# Altium footprint library cool_library.PcbLib: 1182 footprints (part 6 of 75)
Each footprint in its own frame and in the unit in brackets; x right, y up, seen from the top. Pads: shape width x height; smd on the part's side, far side on the other; paste and mask are expansions set on the pad; w line width, h text height; cw(c..) or ccw(c..) is an arc to the next point about the centre after c.
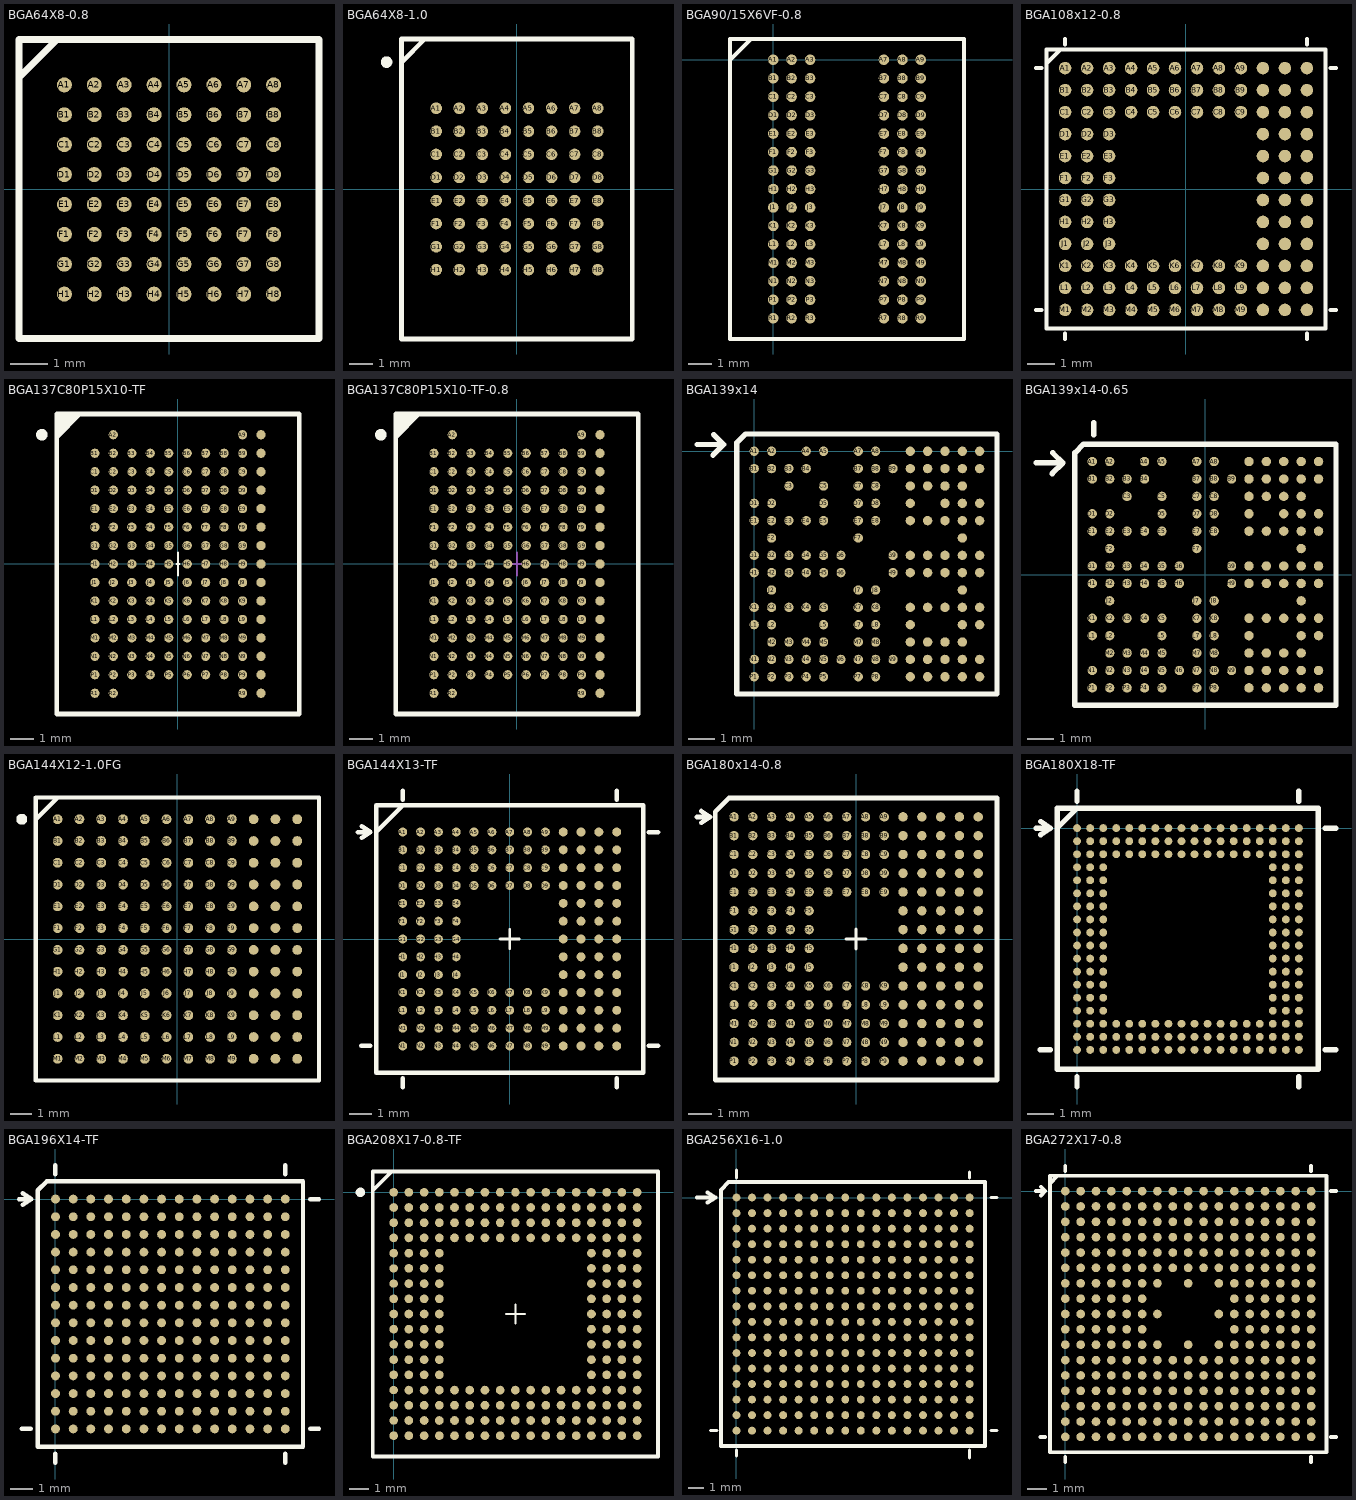
[diagram p5: the footprints below, top view; thin cyan lines are the x and y axes]

## BGA64X8-0.8 [mm]
pads (64):
  round 0.4 smd: A1(-2.8,2.8) A2(-2,2.8) A3(-1.2,2.8) A4(-0.4,2.8) A5(0.4,2.8) A6(1.2,2.8) A7(2,2.8) A8(2.8,2.8) B1(-2.8,2) B2(-2,2) B3(-1.2,2) B4(-0.4,2) B5(0.4,2) B6(1.2,2) B7(2,2) B8(2.8,2) C1(-2.8,1.2) C2(-2,1.2) C3(-1.2,1.2) C4(-0.4,1.2) C5(0.4,1.2) C6(1.2,1.2) C7(2,1.2) C8(2.8,1.2) D1(-2.8,0.4) D2(-2,0.4) D3(-1.2,0.4) D4(-0.4,0.4) D5(0.4,0.4) D6(1.2,0.4) D7(2,0.4) D8(2.8,0.4) E1(-2.8,-0.4) E2(-2,-0.4) E3(-1.2,-0.4) E4(-0.4,-0.4) E5(0.4,-0.4) E6(1.2,-0.4) E7(2,-0.4) E8(2.8,-0.4) F1(-2.8,-1.2) F2(-2,-1.2) F3(-1.2,-1.2) F4(-0.4,-1.2) F5(0.4,-1.2) F6(1.2,-1.2) F7(2,-1.2) F8(2.8,-1.2) G1(-2.8,-2) G2(-2,-2) G3(-1.2,-2) G4(-0.4,-2) G5(0.4,-2) G6(1.2,-2) G7(2,-2) G8(2.8,-2) H1(-2.8,-2.8) H2(-2,-2.8) H3(-1.2,-2.8) H4(-0.4,-2.8) H5(0.4,-2.8) H6(1.2,-2.8) H7(2,-2.8) H8(2.8,-2.8)
Top Overlay:
  lines w0.2: -4.013,2.997 -2.997,4.013 ; 3.987,-3.987 -4.013,-3.987 -4.013,4.013 4.013,4.013 4.013,-3.987

## BGA64X8-1.0 [mm]
height 1.397
pads (64):
  round 0.5 smd: A1(-3.5,3.5) A2(-2.5,3.5) A3(-1.5,3.5) A4(-0.5,3.5) A5(0.5,3.5) A6(1.5,3.5) A7(2.5,3.5) A8(3.5,3.5) B1(-3.5,2.5) B2(-2.5,2.5) B3(-1.5,2.5) B4(-0.5,2.5) B5(0.5,2.5) B6(1.5,2.5) B7(2.5,2.5) B8(3.5,2.5) C1(-3.5,1.5) C2(-2.5,1.5) C3(-1.5,1.5) C4(-0.5,1.5) C5(0.5,1.5) C6(1.5,1.5) C7(2.5,1.5) C8(3.5,1.5) D1(-3.5,0.5) D2(-2.5,0.5) D3(-1.5,0.5) D4(-0.5,0.5) D5(0.5,0.5) D6(1.5,0.5) D7(2.5,0.5) D8(3.5,0.5) E1(-3.5,-0.5) E2(-2.5,-0.5) E3(-1.5,-0.5) E4(-0.5,-0.5) E5(0.5,-0.5) E6(1.5,-0.5) E7(2.5,-0.5) E8(3.5,-0.5) F1(-3.5,-1.5) F2(-2.5,-1.5) F3(-1.5,-1.5) F4(-0.5,-1.5) F5(0.5,-1.5) F6(1.5,-1.5) F7(2.5,-1.5) F8(3.5,-1.5) G1(-3.5,-2.5) G2(-2.5,-2.5) G3(-1.5,-2.5) G4(-0.5,-2.5) G5(0.5,-2.5) G6(1.5,-2.5) G7(2.5,-2.5) G8(3.5,-2.5) H1(-3.5,-3.5) H2(-2.5,-3.5) H3(-1.5,-3.5) H4(-0.5,-3.5) H5(0.5,-3.5) H6(1.5,-3.5) H7(2.5,-3.5) H8(3.5,-3.5)
Top Overlay:
  circle w0.25: c-5.65,5.5 r0.125
  lines w0.2: -5,5.5 -4,6.5 ; -5,-6.5 -5,6.5 5,6.5 5,-6.5 -5,-6.5

## BGA90/15X6VF-0.8 [mil]
pads (90):
  round 18 smd: A1(0,0) A2(31.5,0) A3(62.99,0) A7(188.98,0) A8(220.47,0) A9(251.97,0) B1(0,-31.5) B2(31.5,-31.5) B3(62.99,-31.5) B7(188.98,-31.5) B8(220.47,-31.5) B9(251.97,-31.5) C1(0,-62.99) C2(31.5,-62.99) C3(62.99,-62.99) C7(188.98,-62.99) C8(220.47,-62.99) C9(251.97,-62.99) D1(0,-94.49) D2(31.5,-94.49) D3(62.99,-94.49) D7(188.98,-94.49) D8(220.47,-94.49) D9(251.97,-94.49) E1(0,-125.98) E2(31.5,-125.98) E3(62.99,-125.98) E7(188.98,-125.98) E8(220.47,-125.98) E9(251.97,-125.98) F1(0,-157.48) F2(31.5,-157.48) F3(62.99,-157.48) F7(188.98,-157.48) F8(220.47,-157.48) F9(251.97,-157.48) G1(0,-188.98) G2(31.5,-188.98) G3(62.99,-188.98) G7(188.98,-188.98) G8(220.47,-188.98) G9(251.97,-188.98) H1(0,-220.47) H2(31.5,-220.47) H3(62.99,-220.47) H7(188.98,-220.47) H8(220.47,-220.47) H9(251.97,-220.47) J1(0,-251.97) J2(31.5,-251.97) J3(62.99,-251.97) J7(188.98,-251.97) J8(220.47,-251.97) J9(251.97,-251.97) K1(0,-283.46) K2(31.5,-283.46) K3(62.99,-283.46) K7(188.98,-283.46) K8(220.47,-283.46) K9(251.97,-283.46) L1(0,-314.96) L2(31.5,-314.96) L3(62.99,-314.96) L7(188.98,-314.96) L8(220.47,-314.96) L9(251.97,-314.96) M1(0,-346.46) M2(31.5,-346.46) M3(62.99,-346.46) M7(188.98,-346.46) M8(220.47,-346.46) M9(251.97,-346.46) N1(0,-377.95) N2(31.5,-377.95) N3(62.99,-377.95) N7(188.98,-377.95) N8(220.47,-377.95) N9(251.97,-377.95) P1(0,-409.45) P2(31.5,-409.45) P3(62.99,-409.45) P7(188.98,-409.45) P8(220.47,-409.45) P9(251.97,-409.45) R1(0,-440.95) R2(31.5,-440.95) R3(62.99,-440.95) R7(188.98,-440.95) R8(220.47,-440.95) R9(251.97,-440.95)
Top Overlay:
  lines w7: -74.02,-0.47 -38.02,35.53 ; -74.02,-476.47 -74.02,35.53 325.98,35.53 325.98,-476.47 -74.02,-476.47

## BGA108x12-0.8 [mm]
height 1.016
pads (108):
  round 0.457 smd: A1(-4.4,4.4) A2(-3.6,4.4) A3(-2.8,4.4) A4(-2,4.4) A5(-1.2,4.4) A6(-0.4,4.4) A7(0.4,4.4) A8(1.2,4.4) A9(2,4.4) A10(2.8,4.4) A11(3.6,4.4) A12(4.4,4.4) B1(-4.4,3.6) B2(-3.6,3.6) B3(-2.8,3.6) B4(-2,3.6) B5(-1.2,3.6) B6(-0.4,3.6) B7(0.4,3.6) B8(1.2,3.6) B9(2,3.6) B10(2.8,3.6) B11(3.6,3.6) B12(4.4,3.6) C1(-4.4,2.8) C2(-3.6,2.8) C3(-2.8,2.8) C4(-2,2.8) C5(-1.2,2.8) C6(-0.4,2.8) C7(0.4,2.8) C8(1.2,2.8) C9(2,2.8) C10(2.8,2.8) C11(3.6,2.8) C12(4.4,2.8) D1(-4.4,2) D2(-3.6,2) D3(-2.8,2) D10(2.8,2) D11(3.6,2) D12(4.4,2) E1(-4.4,1.2) E2(-3.6,1.2) E3(-2.8,1.2) E10(2.8,1.2) E11(3.6,1.2) E12(4.4,1.2) F1(-4.4,0.4) F2(-3.6,0.4) F3(-2.8,0.4) F10(2.8,0.4) F11(3.6,0.4) F12(4.4,0.4) G1(-4.4,-0.4) G2(-3.6,-0.4) G3(-2.8,-0.4) G10(2.8,-0.4) G11(3.6,-0.4) G12(4.4,-0.4) H1(-4.4,-1.2) H2(-3.6,-1.2) H3(-2.8,-1.2) H10(2.8,-1.2) H11(3.6,-1.2) H12(4.4,-1.2) J1(-4.4,-2) J2(-3.6,-2) J3(-2.8,-2) J10(2.8,-2) J11(3.6,-2) J12(4.4,-2) K1(-4.4,-2.8) K2(-3.6,-2.8) K3(-2.8,-2.8) K4(-2,-2.8) K5(-1.2,-2.8) K6(-0.4,-2.8) K7(0.4,-2.8) K8(1.2,-2.8) K9(2,-2.8) K10(2.8,-2.8) K11(3.6,-2.8) K12(4.4,-2.8) L1(-4.4,-3.6) L2(-3.6,-3.6) L3(-2.8,-3.6) L4(-2,-3.6) L5(-1.2,-3.6) L6(-0.4,-3.6) L7(0.4,-3.6) L8(1.2,-3.6) L9(2,-3.6) L10(2.8,-3.6) L11(3.6,-3.6) L12(4.4,-3.6) M1(-4.4,-4.4) M2(-3.6,-4.4) M3(-2.8,-4.4) M4(-2,-4.4) M5(-1.2,-4.4) M6(-0.4,-4.4) M7(0.4,-4.4) M8(1.2,-4.4) M9(2,-4.4) M10(2.8,-4.4) M11(3.6,-4.4) M12(4.4,-4.4)
Top Overlay:
  lines w0.152: -5.461,-4.4 -5.258,-4.4 ; -5.461,4.4 -5.258,4.4 ; -5.08,4.572 -4.572,5.08 ; -4.4,-5.461 -4.4,-5.258 ; -4.4,5.258 -4.4,5.461 ; 4.4,-5.461 4.4,-5.258 ; 4.4,5.258 4.4,5.461 ; 5.258,-4.4 5.461,-4.4 ; 5.258,4.4 5.461,4.4 ; -5.08,-5.08 5.08,-5.08 5.08,5.08 -5.08,5.08 -5.08,-5.08

## BGA137C80P15X10-TF [mm] "BGA, 137-Leads, Body 13.0x10.5mm,  Pitch 0.80mm"
height 1.2
pads (137):
  round 0.4 smd: A2(-2.8,5.6) A9(2.8,5.6) A10(3.6,5.6) B1(-3.6,4.8) B2(-2.8,4.8) B3(-2,4.8) B4(-1.2,4.8) B5(-0.4,4.8) B6(0.4,4.8) B7(1.2,4.8) B8(2,4.8) B9(2.8,4.8) B10(3.6,4.8) C1(-3.6,4) C2(-2.8,4) C3(-2,4) C4(-1.2,4) C5(-0.4,4) C6(0.4,4) C7(1.2,4) C8(2,4) C9(2.8,4) C10(3.6,4) D1(-3.6,3.2) D2(-2.8,3.2) D3(-2,3.2) D4(-1.2,3.2) D5(-0.4,3.2) D6(0.4,3.2) D7(1.2,3.2) D8(2,3.2) D9(2.8,3.2) D10(3.6,3.2) E1(-3.6,2.4) E2(-2.8,2.4) E3(-2,2.4) E4(-1.2,2.4) E5(-0.4,2.4) E6(0.4,2.4) E7(1.2,2.4) E8(2,2.4) E9(2.8,2.4) E10(3.6,2.4) F1(-3.6,1.6) F2(-2.8,1.6) F3(-2,1.6) F4(-1.2,1.6) F5(-0.4,1.6) F6(0.4,1.6) F7(1.2,1.6) F8(2,1.6) F9(2.8,1.6) F10(3.6,1.6) G1(-3.6,0.8) G2(-2.8,0.8) G3(-2,0.8) G4(-1.2,0.8) G5(-0.4,0.8) G6(0.4,0.8) G7(1.2,0.8) G8(2,0.8) G9(2.8,0.8) G10(3.6,0.8) H1(-3.6,0) H2(-2.8,0) H3(-2,0) H4(-1.2,0) H5(-0.4,0) H6(0.4,0) H7(1.2,0) H8(2,0) H9(2.8,0) H10(3.6,0) J1(-3.6,-0.8) J2(-2.8,-0.8) J3(-2,-0.8) J4(-1.2,-0.8) J5(-0.4,-0.8) J6(0.4,-0.8) J7(1.2,-0.8) J8(2,-0.8) J9(2.8,-0.8) J10(3.6,-0.8) K1(-3.6,-1.6) K2(-2.8,-1.6) K3(-2,-1.6) K4(-1.2,-1.6) K5(-0.4,-1.6) K6(0.4,-1.6) K7(1.2,-1.6) K8(2,-1.6) K9(2.8,-1.6) K10(3.6,-1.6) L1(-3.6,-2.4) L2(-2.8,-2.4) L3(-2,-2.4) L4(-1.2,-2.4) L5(-0.4,-2.4) L6(0.4,-2.4) L7(1.2,-2.4) L8(2,-2.4) L9(2.8,-2.4) L10(3.6,-2.4) M1(-3.6,-3.2) M2(-2.8,-3.2) M3(-2,-3.2) M4(-1.2,-3.2) M5(-0.4,-3.2) M6(0.4,-3.2) M7(1.2,-3.2) M8(2,-3.2) M9(2.8,-3.2) M10(3.6,-3.2) N1(-3.6,-4) N2(-2.8,-4) N3(-2,-4) N4(-1.2,-4) N5(-0.4,-4) N6(0.4,-4) N7(1.2,-4) N8(2,-4) N9(2.8,-4) N10(3.6,-4) P1(-3.6,-4.8) P2(-2.8,-4.8) P3(-2,-4.8) P4(-1.2,-4.8) P5(-0.4,-4.8) P6(0.4,-4.8) P7(1.2,-4.8) P8(2,-4.8) P9(2.8,-4.8) P10(3.6,-4.8) R1(-3.6,-5.6) R2(-2.8,-5.6) R9(2.8,-5.6) R10(3.6,-5.6)
Top Overlay:
  circle w0.25: c-5.9,5.6 r0.125
  region: -4.25,6.5 -5.25,5.5 -5.25,6.5
  lines w0.1: -0.058,0 0.056,0 ; 0,-0.5 0,0.5
  lines w0.2: -5.25,5.5 -4.25,6.5 ; -5.25,-6.5 -5.25,6.5 5.25,6.5 5.25,-6.5 -5.25,-6.5

## BGA137C80P15X10-TF-0.8 [mm] "BGA, 137-Leads, Body 13.0x10.5mm,  Pitch 0.80mm"
height 1.2
pads (137):
  round 0.4 smd: A2(-2.8,5.6) A9(2.8,5.6) A10(3.6,5.6) B1(-3.6,4.8) B2(-2.8,4.8) B3(-2,4.8) B4(-1.2,4.8) B5(-0.4,4.8) B6(0.4,4.8) B7(1.2,4.8) B8(2,4.8) B9(2.8,4.8) B10(3.6,4.8) C1(-3.6,4) C2(-2.8,4) C3(-2,4) C4(-1.2,4) C5(-0.4,4) C6(0.4,4) C7(1.2,4) C8(2,4) C9(2.8,4) C10(3.6,4) D1(-3.6,3.2) D2(-2.8,3.2) D3(-2,3.2) D4(-1.2,3.2) D5(-0.4,3.2) D6(0.4,3.2) D7(1.2,3.2) D8(2,3.2) D9(2.8,3.2) D10(3.6,3.2) E1(-3.6,2.4) E2(-2.8,2.4) E3(-2,2.4) E4(-1.2,2.4) E5(-0.4,2.4) E6(0.4,2.4) E7(1.2,2.4) E8(2,2.4) E9(2.8,2.4) E10(3.6,2.4) F1(-3.6,1.6) F2(-2.8,1.6) F3(-2,1.6) F4(-1.2,1.6) F5(-0.4,1.6) F6(0.4,1.6) F7(1.2,1.6) F8(2,1.6) F9(2.8,1.6) F10(3.6,1.6) G1(-3.6,0.8) G2(-2.8,0.8) G3(-2,0.8) G4(-1.2,0.8) G5(-0.4,0.8) G6(0.4,0.8) G7(1.2,0.8) G8(2,0.8) G9(2.8,0.8) G10(3.6,0.8) H1(-3.6,0) H2(-2.8,0) H3(-2,0) H4(-1.2,0) H5(-0.4,0) H6(0.4,0) H7(1.2,0) H8(2,0) H9(2.8,0) H10(3.6,0) J1(-3.6,-0.8) J2(-2.8,-0.8) J3(-2,-0.8) J4(-1.2,-0.8) J5(-0.4,-0.8) J6(0.4,-0.8) J7(1.2,-0.8) J8(2,-0.8) J9(2.8,-0.8) J10(3.6,-0.8) K1(-3.6,-1.6) K2(-2.8,-1.6) K3(-2,-1.6) K4(-1.2,-1.6) K5(-0.4,-1.6) K6(0.4,-1.6) K7(1.2,-1.6) K8(2,-1.6) K9(2.8,-1.6) K10(3.6,-1.6) L1(-3.6,-2.4) L2(-2.8,-2.4) L3(-2,-2.4) L4(-1.2,-2.4) L5(-0.4,-2.4) L6(0.4,-2.4) L7(1.2,-2.4) L8(2,-2.4) L9(2.8,-2.4) L10(3.6,-2.4) M1(-3.6,-3.2) M2(-2.8,-3.2) M3(-2,-3.2) M4(-1.2,-3.2) M5(-0.4,-3.2) M6(0.4,-3.2) M7(1.2,-3.2) M8(2,-3.2) M9(2.8,-3.2) M10(3.6,-3.2) N1(-3.6,-4) N2(-2.8,-4) N3(-2,-4) N4(-1.2,-4) N5(-0.4,-4) N6(0.4,-4) N7(1.2,-4) N8(2,-4) N9(2.8,-4) N10(3.6,-4) P1(-3.6,-4.8) P2(-2.8,-4.8) P3(-2,-4.8) P4(-1.2,-4.8) P5(-0.4,-4.8) P6(0.4,-4.8) P7(1.2,-4.8) P8(2,-4.8) P9(2.8,-4.8) P10(3.6,-4.8) R1(-3.6,-5.6) R2(-2.8,-5.6) R9(2.8,-5.6) R10(3.6,-5.6)
Top Overlay:
  circle w0.25: c-5.9,5.6 r0.125
  region: -4.25,6.5 -5.25,5.5 -5.25,6.5
  lines w0.2: -5.25,5.5 -4.25,6.5 ; -5.25,-6.5 5.25,-6.5 5.25,6.5 -5.25,6.5 -5.25,-6.5
Mechanical 13:
  lines w0.1: -5.25,-6.5 5.25,-6.5 5.25,6.5 -5.25,6.5 -5.25,-6.5
Mechanical 15:
  lines w0.1: -0.5,0 0.5,0 ; 0,-0.5 0,0.5

## BGA139x14 [mm]
pads (139):
  round 0.35 smd: A1(0,0) A2(0.65,0) A4(1.95,0) A5(2.6,0) A7(3.9,0) A8(4.55,0) A10(5.85,0) A11(6.5,0) A12(7.15,0) A13(7.8,0) A14(8.45,0) B1(0,-0.65) B2(0.65,-0.65) B3(1.3,-0.65) B4(1.95,-0.65) B7(3.9,-0.65) B8(4.55,-0.65) B9(5.2,-0.65) B10(5.85,-0.65) B11(6.5,-0.65) B12(7.15,-0.65) B13(7.8,-0.65) B14(8.45,-0.65) C3(1.3,-1.3) C5(2.6,-1.3) C7(3.9,-1.3) C8(4.55,-1.3) C10(5.85,-1.3) C11(6.5,-1.3) C12(7.15,-1.3) C13(7.8,-1.3) D1(0,-1.95) D2(0.65,-1.95) D5(2.6,-1.95) D7(3.9,-1.95) D8(4.55,-1.95) D10(5.85,-1.95) D12(7.15,-1.95) D13(7.8,-1.95) D14(8.45,-1.95) E1(0,-2.6) E2(0.65,-2.6) E3(1.3,-2.6) E4(1.95,-2.6) E5(2.6,-2.6) E7(3.9,-2.6) E8(4.55,-2.6) E10(5.85,-2.6) E11(6.5,-2.6) E12(7.15,-2.6) E13(7.8,-2.6) E14(8.45,-2.6) F2(0.65,-3.25) F7(3.9,-3.25) F13(7.8,-3.25) G1(0,-3.9) G2(0.65,-3.9) G3(1.3,-3.9) G4(1.95,-3.9) G5(2.6,-3.9) G6(3.25,-3.9) G9(5.2,-3.9) G10(5.85,-3.9) G11(6.5,-3.9) G12(7.15,-3.9) G13(7.8,-3.9) G14(8.45,-3.9) H1(0,-4.55) H2(0.65,-4.55) H3(1.3,-4.55) H4(1.95,-4.55) H5(2.6,-4.55) H6(3.25,-4.55) H9(5.2,-4.55) H10(5.85,-4.55) H11(6.5,-4.55) H12(7.15,-4.55) H13(7.8,-4.55) H14(8.45,-4.55) J2(0.65,-5.2) J7(3.9,-5.2) J8(4.55,-5.2) J13(7.8,-5.2) K1(0,-5.85) K2(0.65,-5.85) K3(1.3,-5.85) K4(1.95,-5.85) K5(2.6,-5.85) K7(3.9,-5.85) K8(4.55,-5.85) K10(5.85,-5.85) K11(6.5,-5.85) K12(7.15,-5.85) K13(7.8,-5.85) K14(8.45,-5.85) L1(0,-6.5) L2(0.65,-6.5) L5(2.6,-6.5) L7(3.9,-6.5) L8(4.55,-6.5) L10(5.85,-6.5) L13(7.8,-6.5) L14(8.45,-6.5) M2(0.65,-7.15) M3(1.3,-7.15) M4(1.95,-7.15) M5(2.6,-7.15) M7(3.9,-7.15) M8(4.55,-7.15) M10(5.85,-7.15) M11(6.5,-7.15) M12(7.15,-7.15) M13(7.8,-7.15) N1(0,-7.8) N2(0.65,-7.8) N3(1.3,-7.8) N4(1.95,-7.8) N5(2.6,-7.8) N6(3.25,-7.8) N7(3.9,-7.8) N8(4.55,-7.8) N9(5.2,-7.8) N10(5.85,-7.8) N11(6.5,-7.8) N12(7.15,-7.8) N13(7.8,-7.8) N14(8.45,-7.8) P1(0,-8.45) P2(0.65,-8.45) P3(1.3,-8.45) P4(1.95,-8.45) P5(2.6,-8.45) P7(3.9,-8.45) P8(4.55,-8.45) P10(5.85,-8.45) P11(6.5,-8.45) P12(7.15,-8.45) P13(7.8,-8.45) P14(8.45,-8.45)
Top Overlay:
  lines w0.2: -2.143,0.254 -1.143,0.254 ; -1.543,-0.146 -1.143,0.254 ; -1.518,0.629 -1.143,0.254 ; -0.65,-9.1 -0.65,0.325 -0.325,0.65 9.1,0.65 9.1,-9.1 -0.65,-9.1

## BGA139x14-0.65 [mm]
height 1.27
pads (139):
  round 0.35 smd: A1(-4.225,4.225) A2(-3.575,4.225) A4(-2.275,4.225) A5(-1.625,4.225) A7(-0.325,4.225) A8(0.325,4.225) A10(1.625,4.225) A11(2.275,4.225) A12(2.925,4.225) A13(3.575,4.225) A14(4.225,4.225) B1(-4.225,3.575) B2(-3.575,3.575) B3(-2.925,3.575) B4(-2.275,3.575) B7(-0.325,3.575) B8(0.325,3.575) B9(0.975,3.575) B10(1.625,3.575) B11(2.275,3.575) B12(2.925,3.575) B13(3.575,3.575) B14(4.225,3.575) C3(-2.925,2.925) C5(-1.625,2.925) C7(-0.325,2.925) C8(0.325,2.925) C10(1.625,2.925) C11(2.275,2.925) C12(2.925,2.925) C13(3.575,2.925) D1(-4.225,2.275) D2(-3.575,2.275) D5(-1.625,2.275) D7(-0.325,2.275) D8(0.325,2.275) D10(1.625,2.275) D12(2.925,2.275) D13(3.575,2.275) D14(4.225,2.275) E1(-4.225,1.625) E2(-3.575,1.625) E3(-2.925,1.625) E4(-2.275,1.625) E5(-1.625,1.625) E7(-0.325,1.625) E8(0.325,1.625) E10(1.625,1.625) E11(2.275,1.625) E12(2.925,1.625) E13(3.575,1.625) E14(4.225,1.625) F2(-3.575,0.975) F7(-0.325,0.975) F13(3.575,0.975) G1(-4.225,0.325) G2(-3.575,0.325) G3(-2.925,0.325) G4(-2.275,0.325) G5(-1.625,0.325) G6(-0.975,0.325) G9(0.975,0.325) G10(1.625,0.325) G11(2.275,0.325) G12(2.925,0.325) G13(3.575,0.325) G14(4.225,0.325) H1(-4.225,-0.325) H2(-3.575,-0.325) H3(-2.925,-0.325) H4(-2.275,-0.325) H5(-1.625,-0.325) H6(-0.975,-0.325) H9(0.975,-0.325) H10(1.625,-0.325) H11(2.275,-0.325) H12(2.925,-0.325) H13(3.575,-0.325) H14(4.225,-0.325) J2(-3.575,-0.975) J7(-0.325,-0.975) J8(0.325,-0.975) J13(3.575,-0.975) K1(-4.225,-1.625) K2(-3.575,-1.625) K3(-2.925,-1.625) K4(-2.275,-1.625) K5(-1.625,-1.625) K7(-0.325,-1.625) K8(0.325,-1.625) K10(1.625,-1.625) K11(2.275,-1.625) K12(2.925,-1.625) K13(3.575,-1.625) K14(4.225,-1.625) L1(-4.225,-2.275) L2(-3.575,-2.275) L5(-1.625,-2.275) L7(-0.325,-2.275) L8(0.325,-2.275) L10(1.625,-2.275) L13(3.575,-2.275) L14(4.225,-2.275) M2(-3.575,-2.925) M3(-2.925,-2.925) M4(-2.275,-2.925) M5(-1.625,-2.925) M7(-0.325,-2.925) M8(0.325,-2.925) M10(1.625,-2.925) M11(2.275,-2.925) M12(2.925,-2.925) M13(3.575,-2.925) N1(-4.225,-3.575) N2(-3.575,-3.575) N3(-2.925,-3.575) N4(-2.275,-3.575) N5(-1.625,-3.575) N6(-0.975,-3.575) N7(-0.325,-3.575) N8(0.325,-3.575) N9(0.975,-3.575) N10(1.625,-3.575) N11(2.275,-3.575) N12(2.925,-3.575) N13(3.575,-3.575) N14(4.225,-3.575) P1(-4.225,-4.225) P2(-3.575,-4.225) P3(-2.925,-4.225) P4(-2.275,-4.225) P5(-1.625,-4.225) P7(-0.325,-4.225) P8(0.325,-4.225) P10(1.625,-4.225) P11(2.275,-4.225) P12(2.925,-4.225) P13(3.575,-4.225) P14(4.225,-4.225)
Top Overlay:
  lines w0.2: -6.325,4.175 -5.325,4.175 ; -5.725,3.775 -5.325,4.175 ; -5.7,4.55 -5.325,4.175 ; -4.175,5.225 -4.175,5.675 ; -4.875,-4.875 -4.875,4.55 -4.55,4.875 4.875,4.875 4.875,-4.875 -4.875,-4.875

## BGA144X12-1.0FG [mm]
height 1.524
pads (144):
  round 0.45 smd: A1(-5.501,5.504) A2(-4.501,5.504) A3(-3.501,5.504) A4(-2.501,5.504) A5(-1.501,5.504) A6(-0.501,5.504) A7(0.499,5.504) A8(1.499,5.504) A9(2.499,5.504) A10(3.499,5.504) A11(4.499,5.504) A12(5.499,5.504) B1(-5.501,4.504) B2(-4.501,4.504) B3(-3.501,4.504) B4(-2.501,4.504) B5(-1.501,4.504) B6(-0.501,4.504) B7(0.499,4.504) B8(1.499,4.504) B9(2.499,4.504) B10(3.499,4.504) B11(4.499,4.504) B12(5.499,4.504) C1(-5.501,3.504) C2(-4.501,3.504) C3(-3.501,3.504) C4(-2.501,3.504) C5(-1.501,3.504) C6(-0.501,3.504) C7(0.499,3.504) C8(1.499,3.504) C9(2.499,3.504) C10(3.499,3.504) C11(4.499,3.504) C12(5.499,3.504) D1(-5.501,2.504) D2(-4.501,2.504) D3(-3.501,2.504) D4(-2.501,2.504) D5(-1.501,2.504) D6(-0.501,2.504) D7(0.499,2.504) D8(1.499,2.504) D9(2.499,2.504) D10(3.499,2.504) D11(4.499,2.504) D12(5.499,2.504) E1(-5.501,1.504) E2(-4.501,1.504) E3(-3.501,1.504) E4(-2.501,1.504) E5(-1.501,1.504) E6(-0.501,1.504) E7(0.499,1.504) E8(1.499,1.504) E9(2.499,1.504) E10(3.499,1.504) E11(4.499,1.504) E12(5.499,1.504) F1(-5.501,0.504) F2(-4.501,0.504) F3(-3.501,0.504) F4(-2.501,0.504) F5(-1.501,0.504) F6(-0.501,0.504) F7(0.499,0.504) F8(1.499,0.504) F9(2.499,0.504) F10(3.499,0.504) F11(4.499,0.504) F12(5.499,0.504) G1(-5.501,-0.496) G2(-4.501,-0.496) G3(-3.501,-0.496) G4(-2.501,-0.496) G5(-1.501,-0.496) G6(-0.501,-0.496) G7(0.499,-0.496) G8(1.499,-0.496) G9(2.499,-0.496) G10(3.499,-0.496) G11(4.499,-0.496) G12(5.499,-0.496) H1(-5.501,-1.496) H2(-4.501,-1.496) H3(-3.501,-1.496) H4(-2.501,-1.496) H5(-1.501,-1.496) H6(-0.501,-1.496) H7(0.499,-1.496) H8(1.499,-1.496) H9(2.499,-1.496) H10(3.499,-1.496) H11(4.499,-1.496) H12(5.499,-1.496) J1(-5.501,-2.496) J2(-4.501,-2.496) J3(-3.501,-2.496) J4(-2.501,-2.496) J5(-1.501,-2.496) J6(-0.501,-2.496) J7(0.499,-2.496) J8(1.499,-2.496) J9(2.499,-2.496) J10(3.499,-2.496) J11(4.499,-2.496) J12(5.499,-2.496) K1(-5.501,-3.496) K2(-4.501,-3.496) K3(-3.501,-3.496) K4(-2.501,-3.496) K5(-1.501,-3.496) K6(-0.501,-3.496) K7(0.499,-3.496) K8(1.499,-3.496) K9(2.499,-3.496) K10(3.499,-3.496) K11(4.499,-3.496) K12(5.499,-3.496) L1(-5.501,-4.496) L2(-4.501,-4.496) L3(-3.501,-4.496) L4(-2.501,-4.496) L5(-1.501,-4.496) L6(-0.501,-4.496) L7(0.499,-4.496) L8(1.499,-4.496) L9(2.499,-4.496) L10(3.499,-4.496) L11(4.499,-4.496) L12(5.499,-4.496) M1(-5.501,-5.496) M2(-4.501,-5.496) M3(-3.501,-5.496) M4(-2.501,-5.496) M5(-1.501,-5.496) M6(-0.501,-5.496) M7(0.499,-5.496) M8(1.499,-5.496) M9(2.499,-5.496) M10(3.499,-5.496) M11(4.499,-5.496) M12(5.499,-5.496)
Top Overlay:
  circle w0.25: c-7.151,5.504 r0.125
  lines w0.2: -6.501,5.504 -5.501,6.504 ; -6.501,-6.496 -6.501,6.504 6.499,6.504 6.499,-6.496 -6.501,-6.496
